# Altium footprint library General.PCBLIB: 231 footprints (part 11 of 15)
Each footprint in its own frame and in the unit in brackets; x right, y up, seen from the top. Pads: shape width x height; smd on the part's side, far side on the other; paste and mask are expansions set on the pad; w line width, h text height; cw(c..) or ccw(c..) is an arc to the next point about the centre after c.
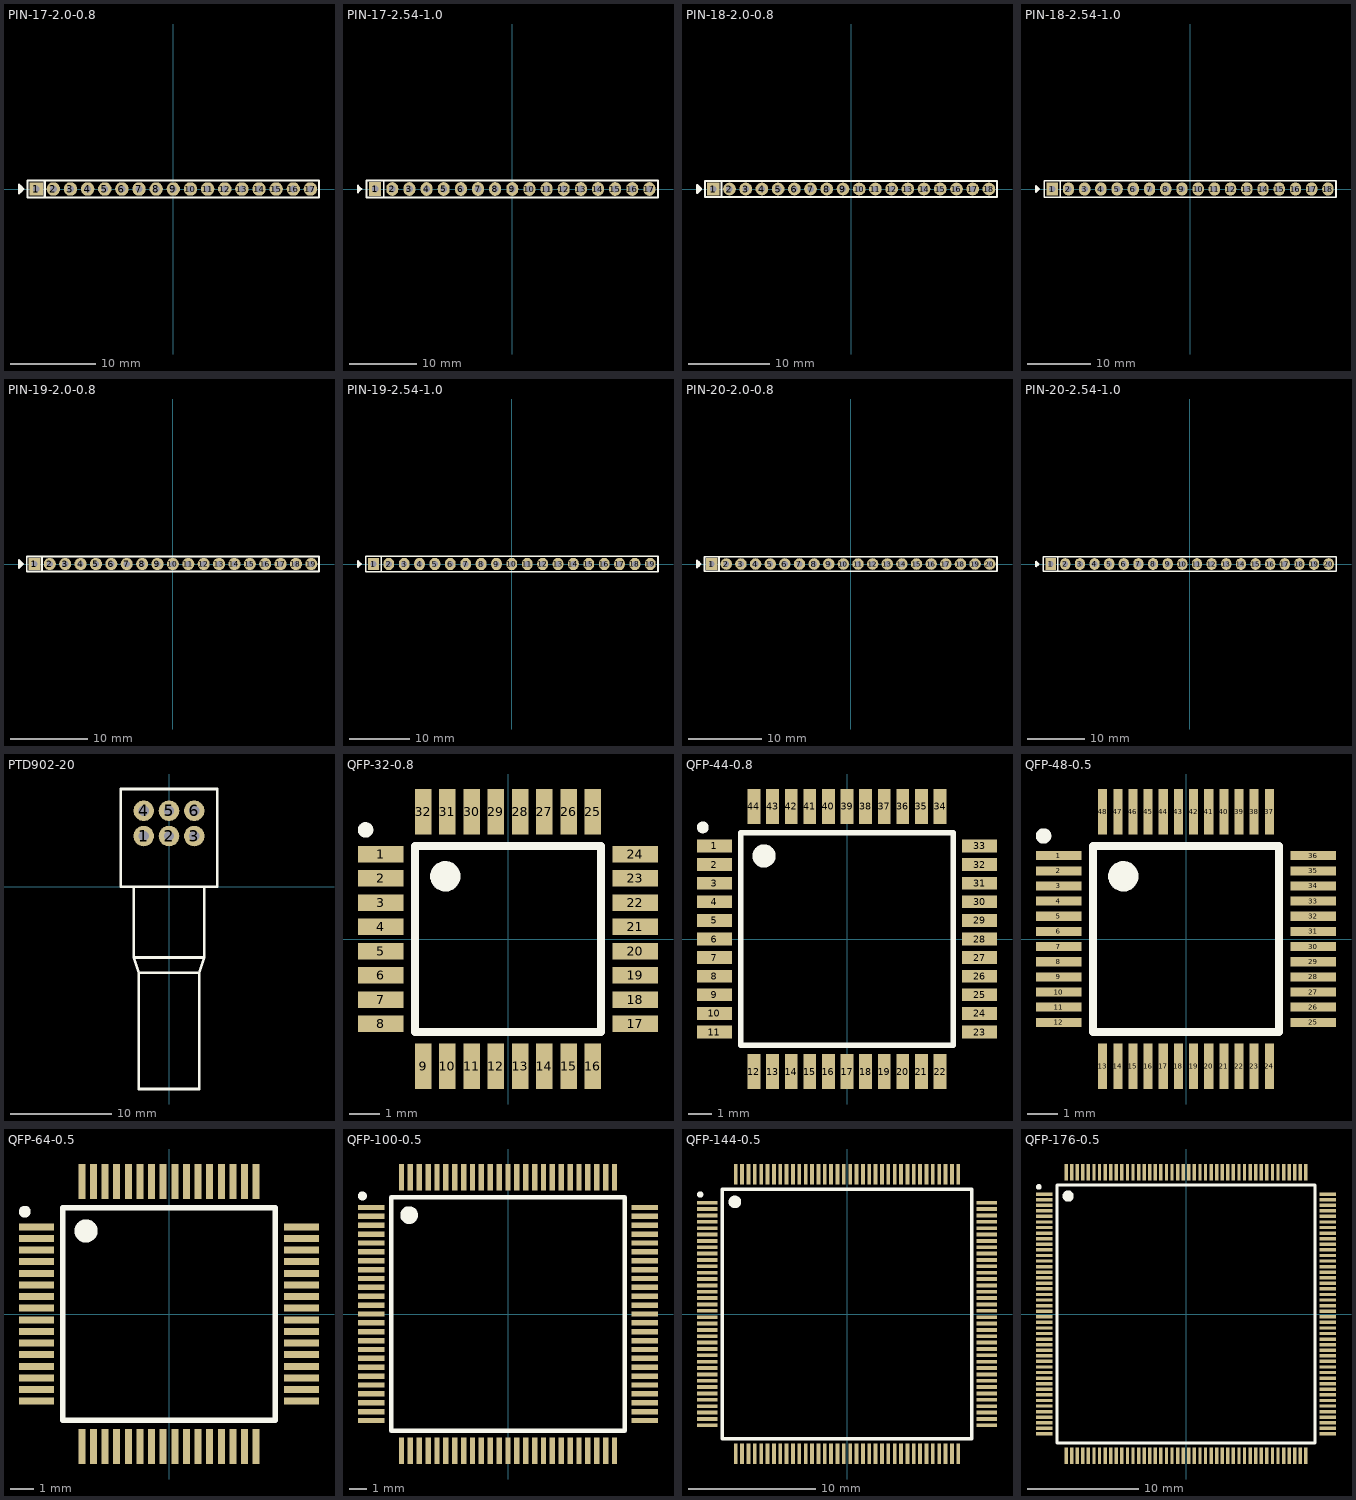
[diagram p10: the footprints below, top view; thin cyan lines are the x and y axes]

## PIN-17-2.0-0.8 [mil] "Pin Header"
height 149.61
pads (17):
  rect 62x62 hole 31.5: 1(-629.92,0)
  round 62 hole 31.5: 2(-551.18,0) 3(-472.44,0) 4(-393.7,0) 5(-314.96,0) 6(-236.22,0) 7(-157.48,0) 8(-78.74,0) 9(0,0) 10(78.74,0) 11(157.48,0) 12(236.22,0) 13(314.96,0) 14(393.7,0) 15(472.44,0) 16(551.18,0) 17(629.92,0)
Top Overlay:
  lines w10: -698.98,-10 -698.98,10 ; -590.55,-39.37 -590.55,39.37 ; -708.98,-20 -708.98,20 -688.98,0 -708.98,-20 ; -669.29,-39.37 669.29,-39.37 669.29,39.37 -669.29,39.37 -669.29,-39.37
3D body "Samtec-MTMM-117-02-G-S-150.STEP": height 209, standoff -46, extent -669.29,-39.37 668.61,39.33

## PIN-17-2.54-1.0 [mil] "Pin Header"
height 374.02
pads (17):
  rect 70x80 hole 39.37: 1(-800,0)
  oval 70x80 hole 39.37: 2(-700,0) 3(-600,0) 4(-500,0) 5(-400,0) 6(-300,0) 7(-200,0) 8(-100,0) 9(0,0) 10(100,0) 11(200,0) 12(300,0) 13(400,0) 14(500,0) 15(600,0) 16(700,0) 17(800,0)
Top Overlay:
  lines w10: -890,-10 -890,10 ; -750,-50 -750,50 ; -900,-20 -900,20 -880,0 -900,-20 ; -850,-50 -850,50 850,50 850,-50 -850,-50
3D body "PIN17_100mils.STEP": height 397.64, standoff -59.06, extent -850,-50 850,50

## PIN-18-2.0-0.8 [mm] "Pin Header"
height 3.8
pads (18):
  rect 1.575x1.575 hole 0.8: 1(-17,0)
  round 1.575 hole 0.8: 2(-15,0) 3(-13,0) 4(-11,0) 5(-9,0) 6(-7,0) 7(-5,0) 8(-3,0) 9(-1,0) 10(1,0) 11(3,0) 12(5,0) 13(7,0) 14(9,0) 15(11,0) 16(13,0) 17(15,0) 18(17,0)
Top Overlay:
  lines w0.254: -18.754,-0.254 -18.754,0.254 ; -16,-1 -16,1 ; -19.008,-0.508 -19.008,0.508 -18.5,0 -19.008,-0.508 ; -18,-1 18,-1 18,1 -18,1 -18,-1
3D body "Samtec-MTMM-118-02-G-S-150.STEP": height 5.31, standoff -1.17, extent -18,-1 17.982,0.999

## PIN-18-2.54-1.0 [mil] "Pin Header"
height 374.02
pads (18):
  rect 70x80 hole 39.37: 1(-850,0)
  oval 70x80 hole 39.37: 2(-750,0) 3(-650,0) 4(-550,0) 5(-450,0) 6(-350,0) 7(-250,0) 8(-150,0) 9(-50,0) 10(50,0) 11(150,0) 12(250,0) 13(350,0) 14(450,0) 15(550,0) 16(650,0) 17(750,0) 18(850,0)
Top Overlay:
  lines w10: -940,-10 -940,10 ; -800,-50 -800,50 ; -950,-20 -950,20 -930,0 -950,-20 ; -900,-50 -900,50 900,50 900,-50 -900,-50
3D body "PIN18_100mils.STEP": height 397.64, standoff -59.06, extent -900,-50 900,50

## PIN-19-2.0-0.8 [mil] "Pin Header"
height 149.61
pads (19):
  rect 62x62 hole 31.5: 1(-708.66,0)
  round 62 hole 31.5: 2(-629.92,0) 3(-551.18,0) 4(-472.44,0) 5(-393.7,0) 6(-314.96,0) 7(-236.22,0) 8(-157.48,0) 9(-78.74,0) 10(0,0) 11(78.74,0) 12(157.48,0) 13(236.22,0) 14(314.96,0) 15(393.7,0) 16(472.44,0) 17(551.18,0) 18(629.92,0) 19(708.66,0)
Top Overlay:
  lines w10: -777.72,-10 -777.72,10 ; -669.29,-39.37 -669.29,39.37 ; -787.72,-20 -787.72,20 -767.72,0 -787.72,-20 ; -748.03,-39.37 748.03,-39.37 748.03,39.37 -748.03,39.37 -748.03,-39.37
3D body "Samtec-MTMM-119-02-G-S-150.STEP": height 209, standoff -46, extent -748.03,-39.37 747.27,39.33

## PIN-19-2.54-1.0 [mil] "Pin Header"
height 374.02
pads (19):
  rect 70x80 hole 39.37: 1(-900,0)
  oval 70x80 hole 39.37: 2(-800,0) 3(-700,0) 4(-600,0) 5(-500,0) 6(-400,0) 7(-300,0) 8(-200,0) 9(-100,0) 10(0,0) 11(100,0) 12(200,0) 13(300,0) 14(400,0) 15(500,0) 16(600,0) 17(700,0) 18(800,0) 19(900,0)
Top Overlay:
  lines w10: -990,-10 -990,10 ; -850,-50 -850,50 ; -1000,-20 -1000,20 -980,0 -1000,-20 ; -950,-50 -950,50 950,50 950,-50 -950,-50
3D body "PIN19_100mils.STEP": height 397.64, standoff -59.06, extent -950,-50 950,50

## PIN-20-2.0-0.8 [mm] "Pin Header"
height 3.8
pads (20):
  rect 1.575x1.575 hole 0.8: 1(-19,0)
  round 1.575 hole 0.8: 2(-17,0) 3(-15,0) 4(-13,0) 5(-11,0) 6(-9,0) 7(-7,0) 8(-5,0) 9(-3,0) 10(-1,0) 11(1,0) 12(3,0) 13(5,0) 14(7,0) 15(9,0) 16(11,0) 17(13,0) 18(15,0) 19(17,0) 20(19,0)
Top Overlay:
  lines w0.254: -20.754,-0.254 -20.754,0.254 ; -18,-1 -18,1 ; -21.008,-0.508 -20.5,0 -21.008,0.508 -21.008,-0.508 ; -20,-1 -20,1 20,1 20,-1 -20,-1
3D body "Samtec-MTMM-120-02-G-S-150.STEP": height 5.31, standoff -1.17, extent -20,-1 19.98,0.999

## PIN-20-2.54-1.0 [mil] "Pin Header"
height 374.02
pads (20):
  rect 70x80 hole 39.37: 1(-950,0)
  oval 70x80 hole 39.37: 2(-850,0) 3(-750,0) 4(-650,0) 5(-550,0) 6(-450,0) 7(-350,0) 8(-250,0) 9(-150,0) 10(-50,0) 11(50,0) 12(150,0) 13(250,0) 14(350,0) 15(450,0) 16(550,0) 17(650,0) 18(750,0) 19(850,0) 20(950,0)
Top Overlay:
  lines w10: -1040,-10 -1040,10 ; -900,-50 -900,50 ; -1050,-20 -1050,20 -1030,0 -1050,-20 ; -1000,-50 -1000,50 1000,50 1000,-50 -1000,-50
3D body "PIN20_100mils.STEP": height 397.64, standoff -59.06, extent -1000,-50 1000,50

## PTD902-20 [mm] "Potentiometer, Shaft Length 20mm, BOURNS"
height 11.3
pads (6):
  round 2.032 hole 1: 1(-2.5,5) 2(0,5) 3(2.5,5) 4(-2.5,7.5) 5(0,7.5) 6(2.5,7.5)
Top Overlay:
  lines w0.254: -3.5,0 -3.5,-7 ; 3.5,0 3.5,-7 ; -3.5,-7 3.5,-7 ; -3.5,-7 -3,-8.5 ; -3,-8.5 -3,-20 3,-20 3,-8.5 ; -3,-8.5 3,-8.5 ; 3,-8.5 3.5,-7 ; -4.75,0 -4.75,9.65 4.75,9.65 4.75,0 -4.75,0
3D body "POT-Vishay-P9.STEP": height 11.94, standoff -3.5, extent -5.72,-20.03 5.725,7.151

## QFP-32-0.8 [mm] "QFP-32"
height 1.2
pads (32):
  rect 1.5x0.55 smd: 1(-4.2,2.8) 2(-4.2,2) 3(-4.2,1.2) 4(-4.2,0.4) 5(-4.2,-0.4) 6(-4.2,-1.2) 7(-4.2,-2) 8(-4.2,-2.8) 17(4.2,-2.8) 18(4.2,-2) 19(4.2,-1.2) 20(4.2,-0.4) 21(4.2,0.4) 22(4.2,1.2) 23(4.2,2) 24(4.2,2.8)
  rect 0.55x1.5 smd: 9(-2.8,-4.2) 10(-2,-4.2) 11(-1.2,-4.2) 12(-0.4,-4.2) 13(0.4,-4.2) 14(1.2,-4.2) 15(2,-4.2) 16(2.8,-4.2) 25(2.8,4.2) 26(2,4.2) 27(1.2,4.2) 28(0.4,4.2) 29(-0.4,4.2) 30(-1.2,4.2) 31(-2,4.2) 32(-2.8,4.2)
Top Overlay:
  circle w0.5: c-2.07,2.07 r0.25
  circle w0.254: c-4.7,3.6 r0.127
  lines w0.254: -3.07,-3.07 -3.07,3.07 3.07,3.07 3.07,-3.07 -3.07,-3.07
3D body "QFP80P900X900X120-32N.STEP": height 1.35, standoff 0, extent -4.51,-4.51 4.511,4.511

## QFP-44-0.8 [mm] "QFP-44"
height 1.6
pads (44):
  rect 1.5x0.55 smd: 1(-5.7,4) 2(-5.7,3.2) 3(-5.7,2.4) 4(-5.7,1.6) 5(-5.7,0.8) 6(-5.7,0) 7(-5.7,-0.8) 8(-5.7,-1.6) 9(-5.7,-2.4) 10(-5.7,-3.2) 11(-5.7,-4) 23(5.7,-4) 24(5.7,-3.2) 25(5.7,-2.4) 26(5.7,-1.6) 27(5.7,-0.8) 28(5.7,0) 29(5.7,0.8) 30(5.7,1.6) 31(5.7,2.4) 32(5.7,3.2) 33(5.7,4)
  rect 0.55x1.5 smd: 12(-4,-5.7) 13(-3.2,-5.7) 14(-2.4,-5.7) 15(-1.6,-5.7) 16(-0.8,-5.7) 17(0,-5.7) 18(0.8,-5.7) 19(1.6,-5.7) 20(2.4,-5.7) 21(3.2,-5.7) 22(4,-5.7) 34(4,5.7) 35(3.2,5.7) 36(2.4,5.7) 37(1.6,5.7) 38(0.8,5.7) 39(0,5.7) 40(-0.8,5.7) 41(-1.6,5.7) 42(-2.4,5.7) 43(-3.2,5.7) 44(-4,5.7)
Top Overlay:
  circle w0.254: c-6.2,4.8 r0.127
  circle w0.5: c-3.57,3.57 r0.25
  lines w0.254: -4.57,-4.57 4.57,-4.57 4.57,4.57 -4.57,4.57 -4.57,-4.57
3D body "QFP80P1200X1200X145-44N.STEP": height 1.6, standoff 0, extent -6.01,-6.01 6.011,6.011

## QFP-48-0.5 [mm] "QFP-48"
height 1.6
pads (48):
  rect 1.5x0.3 smd: 1(-4.2,2.75) 2(-4.2,2.25) 3(-4.2,1.75) 4(-4.2,1.25) 5(-4.2,0.75) 6(-4.2,0.25) 7(-4.2,-0.25) 8(-4.2,-0.75) 9(-4.2,-1.25) 10(-4.2,-1.75) 11(-4.2,-2.25) 12(-4.2,-2.75) 25(4.2,-2.75) 26(4.2,-2.25) 27(4.2,-1.75) 28(4.2,-1.25) 29(4.2,-0.75) 30(4.2,-0.25) 31(4.2,0.25) 32(4.2,0.75) 33(4.2,1.25) 34(4.2,1.75) 35(4.2,2.25) 36(4.2,2.75)
  rect 0.3x1.5 smd: 13(-2.75,-4.2) 14(-2.25,-4.2) 15(-1.75,-4.2) 16(-1.25,-4.2) 17(-0.75,-4.2) 18(-0.25,-4.2) 19(0.25,-4.2) 20(0.75,-4.2) 21(1.25,-4.2) 22(1.75,-4.2) 23(2.25,-4.2) 24(2.75,-4.2) 37(2.75,4.2) 38(2.25,4.2) 39(1.75,4.2) 40(1.25,4.2) 41(0.75,4.2) 42(0.25,4.2) 43(-0.25,4.2) 44(-0.75,4.2) 45(-1.25,4.2) 46(-1.75,4.2) 47(-2.25,4.2) 48(-2.75,4.2)
Top Overlay:
  circle w0.5: c-2.07,2.07 r0.25
  circle w0.254: c-4.7,3.4 r0.127
  lines w0.254: -3.07,-3.07 -3.07,3.07 3.07,3.07 3.07,-3.07 -3.07,-3.07
3D body "QFP50P900X900X145-48N.STEP": height 1.6, standoff 0, extent -4.515,-4.515 4.513,4.513

## QFP-64-0.5 [mm] "QFP-64"
height 1.6
pads (64):
  rect 1.5x0.3 smd: 1(-5.7,3.75) 2(-5.7,3.25) 3(-5.7,2.75) 4(-5.7,2.25) 5(-5.7,1.75) 6(-5.7,1.25) 7(-5.7,0.75) 8(-5.7,0.25) 9(-5.7,-0.25) 10(-5.7,-0.75) 11(-5.7,-1.25) 12(-5.7,-1.75) 13(-5.7,-2.25) 14(-5.7,-2.75) 15(-5.7,-3.25) 16(-5.7,-3.75) 33(5.7,-3.75) 34(5.7,-3.25) 35(5.7,-2.75) 36(5.7,-2.25) 37(5.7,-1.75) 38(5.7,-1.25) 39(5.7,-0.75) 40(5.7,-0.25) 41(5.7,0.25) 42(5.7,0.75) 43(5.7,1.25) 44(5.7,1.75) 45(5.7,2.25) 46(5.7,2.75) 47(5.7,3.25) 48(5.7,3.75)
  rect 0.3x1.5 smd: 17(-3.75,-5.7) 18(-3.25,-5.7) 19(-2.75,-5.7) 20(-2.25,-5.7) 21(-1.75,-5.7) 22(-1.25,-5.7) 23(-0.75,-5.7) 24(-0.25,-5.7) 25(0.25,-5.7) 26(0.75,-5.7) 27(1.25,-5.7) 28(1.75,-5.7) 29(2.25,-5.7) 30(2.75,-5.7) 31(3.25,-5.7) 32(3.75,-5.7) 49(3.75,5.7) 50(3.25,5.7) 51(2.75,5.7) 52(2.25,5.7) 53(1.75,5.7) 54(1.25,5.7) 55(0.75,5.7) 56(0.25,5.7) 57(-0.25,5.7) 58(-0.75,5.7) 59(-1.25,5.7) 60(-1.75,5.7) 61(-2.25,5.7) 62(-2.75,5.7) 63(-3.25,5.7) 64(-3.75,5.7)
Top Overlay:
  circle w0.254: c-6.2,4.4 r0.127
  circle w0.5: c-3.57,3.57 r0.25
  lines w0.254: -4.57,-4.57 4.57,-4.57 4.57,4.57 -4.57,4.57 -4.57,-4.57
3D body "QFP50P1200X1200X145-64N.STEP": height 1.6, standoff 0, extent -6.015,-6.015 6.013,6.013

## QFP-100-0.5 [mm] "QFP-100"
height 1.6
pads (100):
  rect 1.5x0.3 smd: 1(-7.7,6) 2(-7.7,5.5) 3(-7.7,5) 4(-7.7,4.5) 5(-7.7,4) 6(-7.7,3.5) 7(-7.7,3) 8(-7.7,2.5) 9(-7.7,2) 10(-7.7,1.5) 11(-7.7,1) 12(-7.7,0.5) 13(-7.7,0) 14(-7.7,-0.5) 15(-7.7,-1) 16(-7.7,-1.5) 17(-7.7,-2) 18(-7.7,-2.5) 19(-7.7,-3) 20(-7.7,-3.5) 21(-7.7,-4) 22(-7.7,-4.5) 23(-7.7,-5) 24(-7.7,-5.5) 25(-7.7,-6) 51(7.7,-6) 52(7.7,-5.5) 53(7.7,-5) 54(7.7,-4.5) 55(7.7,-4) 56(7.7,-3.5) 57(7.7,-3) 58(7.7,-2.5) 59(7.7,-2) 60(7.7,-1.5) 61(7.7,-1) 62(7.7,-0.5) 63(7.7,0) 64(7.7,0.5) 65(7.7,1) 66(7.7,1.5) 67(7.7,2) 68(7.7,2.5) 69(7.7,3) 70(7.7,3.5) 71(7.7,4) 72(7.7,4.5) 73(7.7,5) 74(7.7,5.5) 75(7.7,6)
  rect 0.3x1.5 smd: 26(-6,-7.7) 27(-5.5,-7.7) 28(-5,-7.7) 29(-4.5,-7.7) 30(-4,-7.7) 31(-3.5,-7.7) 32(-3,-7.7) 33(-2.5,-7.7) 34(-2,-7.7) 35(-1.5,-7.7) 36(-1,-7.7) 37(-0.5,-7.7) 38(0,-7.7) 39(0.5,-7.7) 40(1,-7.7) 41(1.5,-7.7) 42(2,-7.7) 43(2.5,-7.7) 44(3,-7.7) 45(3.5,-7.7) 46(4,-7.7) 47(4.5,-7.7) 48(5,-7.7) 49(5.5,-7.7) 50(6,-7.7) 76(6,7.7) 77(5.5,7.7) 78(5,7.7) 79(4.5,7.7) 80(4,7.7) 81(3.5,7.7) 82(3,7.7) 83(2.5,7.7) 84(2,7.7) 85(1.5,7.7) 86(1,7.7) 87(0.5,7.7) 88(0,7.7) 89(-0.5,7.7) 90(-1,7.7) 91(-1.5,7.7) 92(-2,7.7) 93(-2.5,7.7) 94(-3,7.7) 95(-3.5,7.7) 96(-4,7.7) 97(-4.5,7.7) 98(-5,7.7) 99(-5.5,7.7) 100(-6,7.7)
Top Overlay:
  circle w0.5: c-5.57,5.57 r0.25
  circle w0.254: c-8.2,6.65 r0.127
  lines w0.254: -6.57,-6.57 -6.57,6.57 6.57,6.57 6.57,-6.57 -6.57,-6.57
3D body "QFP50P1600X1600X145-100N.STEP": height 1.6, standoff 0, extent -8.015,-8.015 8.013,8.013

## QFP-144-0.5 [mm] "QFP-144"
height 1.6
pads (144):
  rect 1.6x0.3 smd: 1(-11,8.75) 2(-11,8.25) 3(-11,7.75) 4(-11,7.25) 5(-11,6.75) 6(-11,6.25) 7(-11,5.75) 8(-11,5.25) 9(-11,4.75) 10(-11,4.25) 11(-11,3.75) 12(-11,3.25) 13(-11,2.75) 14(-11,2.25) 15(-11,1.75) 16(-11,1.25) 17(-11,0.75) 18(-11,0.25) 19(-11,-0.25) 20(-11,-0.75) 21(-11,-1.25) 22(-11,-1.75) 23(-11,-2.25) 24(-11,-2.75) 25(-11,-3.25) 26(-11,-3.75) 27(-11,-4.25) 28(-11,-4.75) 29(-11,-5.25) 30(-11,-5.75) 31(-11,-6.25) 32(-11,-6.75) 33(-11,-7.25) 34(-11,-7.75) 35(-11,-8.25) 36(-11,-8.75) 73(11,-8.75) 74(11,-8.25) 75(11,-7.75) 76(11,-7.25) 77(11,-6.75) 78(11,-6.25) 79(11,-5.75) 80(11,-5.25) 81(11,-4.75) 82(11,-4.25) 83(11,-3.75) 84(11,-3.25) 85(11,-2.75) 86(11,-2.25) 87(11,-1.75) 88(11,-1.25) 89(11,-0.75) 90(11,-0.25) 91(11,0.25) 92(11,0.75) 93(11,1.25) 94(11,1.75) 95(11,2.25) 96(11,2.75) 97(11,3.25) 98(11,3.75) 99(11,4.25) 100(11,4.75) 101(11,5.25) 102(11,5.75) 103(11,6.25) 104(11,6.75) 105(11,7.25) 106(11,7.75) 107(11,8.25) 108(11,8.75)
  rect 0.3x1.6 smd: 37(-8.75,-11) 38(-8.25,-11) 39(-7.75,-11) 40(-7.25,-11) 41(-6.75,-11) 42(-6.25,-11) 43(-5.75,-11) 44(-5.25,-11) 45(-4.75,-11) 46(-4.25,-11) 47(-3.75,-11) 48(-3.25,-11) 49(-2.75,-11) 50(-2.25,-11) 51(-1.75,-11) 52(-1.25,-11) 53(-0.75,-11) 54(-0.25,-11) 55(0.25,-11) 56(0.75,-11) 57(1.25,-11) 58(1.75,-11) 59(2.25,-11) 60(2.75,-11) 61(3.25,-11) 62(3.75,-11) 63(4.25,-11) 64(4.75,-11) 65(5.25,-11) 66(5.75,-11) 67(6.25,-11) 68(6.75,-11) 69(7.25,-11) 70(7.75,-11) 71(8.25,-11) 72(8.75,-11) 109(8.75,11) 110(8.25,11) 111(7.75,11) 112(7.25,11) 113(6.75,11) 114(6.25,11) 115(5.75,11) 116(5.25,11) 117(4.75,11) 118(4.25,11) 119(3.75,11) 120(3.25,11) 121(2.75,11) 122(2.25,11) 123(1.75,11) 124(1.25,11) 125(0.75,11) 126(0.25,11) 127(-0.25,11) 128(-0.75,11) 129(-1.25,11) 130(-1.75,11) 131(-2.25,11) 132(-2.75,11) 133(-3.25,11) 134(-3.75,11) 135(-4.25,11) 136(-4.75,11) 137(-5.25,11) 138(-5.75,11) 139(-6.25,11) 140(-6.75,11) 141(-7.25,11) 142(-7.75,11) 143(-8.25,11) 144(-8.75,11)
Top Overlay:
  circle w0.254: c-11.55,9.4 r0.127
  circle w0.5: c-8.82,8.82 r0.25
  lines w0.254: -9.82,-9.82 9.82,-9.82 9.82,9.82 -9.82,9.82 -9.82,-9.82
3D body "TQFP-144.STEP": height 1.65, standoff 0, extent -11,-11 11,11

## QFP-176-0.5 [mm] "QFP-176"
height 1.6
pads (176):
  rect 1.5x0.3 smd: 1(-12.7,10.75) 2(-12.7,10.25) 3(-12.7,9.75) 4(-12.7,9.25) 5(-12.7,8.75) 6(-12.7,8.25) 7(-12.7,7.75) 8(-12.7,7.25) 9(-12.7,6.75) 10(-12.7,6.25) 11(-12.7,5.75) 12(-12.7,5.25) 13(-12.7,4.75) 14(-12.7,4.25) 15(-12.7,3.75) 16(-12.7,3.25) 17(-12.7,2.75) 18(-12.7,2.25) 19(-12.7,1.75) 20(-12.7,1.25) 21(-12.7,0.75) 22(-12.7,0.25) 23(-12.7,-0.25) 24(-12.7,-0.75) 25(-12.7,-1.25) 26(-12.7,-1.75) 27(-12.7,-2.25) 28(-12.7,-2.75) 29(-12.7,-3.25) 30(-12.7,-3.75) 31(-12.7,-4.25) 32(-12.7,-4.75) 33(-12.7,-5.25) 34(-12.7,-5.75) 35(-12.7,-6.25) 36(-12.7,-6.75) 37(-12.7,-7.25) 38(-12.7,-7.75) 39(-12.7,-8.25) 40(-12.7,-8.75) 41(-12.7,-9.25) 42(-12.7,-9.75) 43(-12.7,-10.25) 44(-12.7,-10.75) 89(12.7,-10.75) 90(12.7,-10.25) 91(12.7,-9.75) 92(12.7,-9.25) 93(12.7,-8.75) 94(12.7,-8.25) 95(12.7,-7.75) 96(12.7,-7.25) 97(12.7,-6.75) 98(12.7,-6.25) 99(12.7,-5.75) 100(12.7,-5.25) 101(12.7,-4.75) 102(12.7,-4.25) 103(12.7,-3.75) 104(12.7,-3.25) 105(12.7,-2.75) 106(12.7,-2.25) 107(12.7,-1.75) 108(12.7,-1.25) 109(12.7,-0.75) 110(12.7,-0.25) 111(12.7,0.25) 112(12.7,0.75) 113(12.7,1.25) 114(12.7,1.75) 115(12.7,2.25) 116(12.7,2.75) 117(12.7,3.25) 118(12.7,3.75) 119(12.7,4.25) 120(12.7,4.75) 121(12.7,5.25) 122(12.7,5.75) 123(12.7,6.25) 124(12.7,6.75) 125(12.7,7.25) 126(12.7,7.75) 127(12.7,8.25) 128(12.7,8.75) 129(12.7,9.25) 130(12.7,9.75) 131(12.7,10.25) 132(12.7,10.75)
  rect 0.3x1.5 smd: 45(-10.75,-12.7) 46(-10.25,-12.7) 47(-9.75,-12.7) 48(-9.25,-12.7) 49(-8.75,-12.7) 50(-8.25,-12.7) 51(-7.75,-12.7) 52(-7.25,-12.7) 53(-6.75,-12.7) 54(-6.25,-12.7) 55(-5.75,-12.7) 56(-5.25,-12.7) 57(-4.75,-12.7) 58(-4.25,-12.7) 59(-3.75,-12.7) 60(-3.25,-12.7) 61(-2.75,-12.7) 62(-2.25,-12.7) 63(-1.75,-12.7) 64(-1.25,-12.7) 65(-0.75,-12.7) 66(-0.25,-12.7) 67(0.25,-12.7) 68(0.75,-12.7) 69(1.25,-12.7) 70(1.75,-12.7) 71(2.25,-12.7) 72(2.75,-12.7) 73(3.25,-12.7) 74(3.75,-12.7) 75(4.25,-12.7) 76(4.75,-12.7) 77(5.25,-12.7) 78(5.75,-12.7) 79(6.25,-12.7) 80(6.75,-12.7) 81(7.25,-12.7) 82(7.75,-12.7) 83(8.25,-12.7) 84(8.75,-12.7) 85(9.25,-12.7) 86(9.75,-12.7) 87(10.25,-12.7) 88(10.75,-12.7) 133(10.75,12.7) 134(10.25,12.7) 135(9.75,12.7) 136(9.25,12.7) 137(8.75,12.7) 138(8.25,12.7) 139(7.75,12.7) 140(7.25,12.7) 141(6.75,12.7) 142(6.25,12.7) 143(5.75,12.7) 144(5.25,12.7) 145(4.75,12.7) 146(4.25,12.7) 147(3.75,12.7) 148(3.25,12.7) 149(2.75,12.7) 150(2.25,12.7) 151(1.75,12.7) 152(1.25,12.7) 153(0.75,12.7) 154(0.25,12.7) 155(-0.25,12.7) 156(-0.75,12.7) 157(-1.25,12.7) 158(-1.75,12.7) 159(-2.25,12.7) 160(-2.75,12.7) 161(-3.25,12.7) 162(-3.75,12.7) 163(-4.25,12.7) 164(-4.75,12.7) 165(-5.25,12.7) 166(-5.75,12.7) 167(-6.25,12.7) 168(-6.75,12.7) 169(-7.25,12.7) 170(-7.75,12.7) 171(-8.25,12.7) 172(-8.75,12.7) 173(-9.25,12.7) 174(-9.75,12.7) 175(-10.25,12.7) 176(-10.75,12.7)
Top Overlay:
  circle w0.254: c-13.2,11.4 r0.127
  circle w0.5: c-10.57,10.57 r0.25
  lines w0.254: -11.57,-11.57 11.57,-11.57 11.57,11.57 -11.57,11.57 -11.57,-11.57
3D body "QFP50P2600X2600X145-176N.STEP": height 1.6, standoff 0, extent -13.015,-13.015 13.013,13.013